# Altium footprint library Connect.PcbLib: 272 footprints (part 16 of 17)
Each footprint in its own frame and in the unit in brackets; x right, y up, seen from the top. Pads: shape width x height; smd on the part's side, far side on the other; paste and mask are expansions set on the pad; w line width, h text height; cw(c..) or ccw(c..) is an arc to the next point about the centre after c.
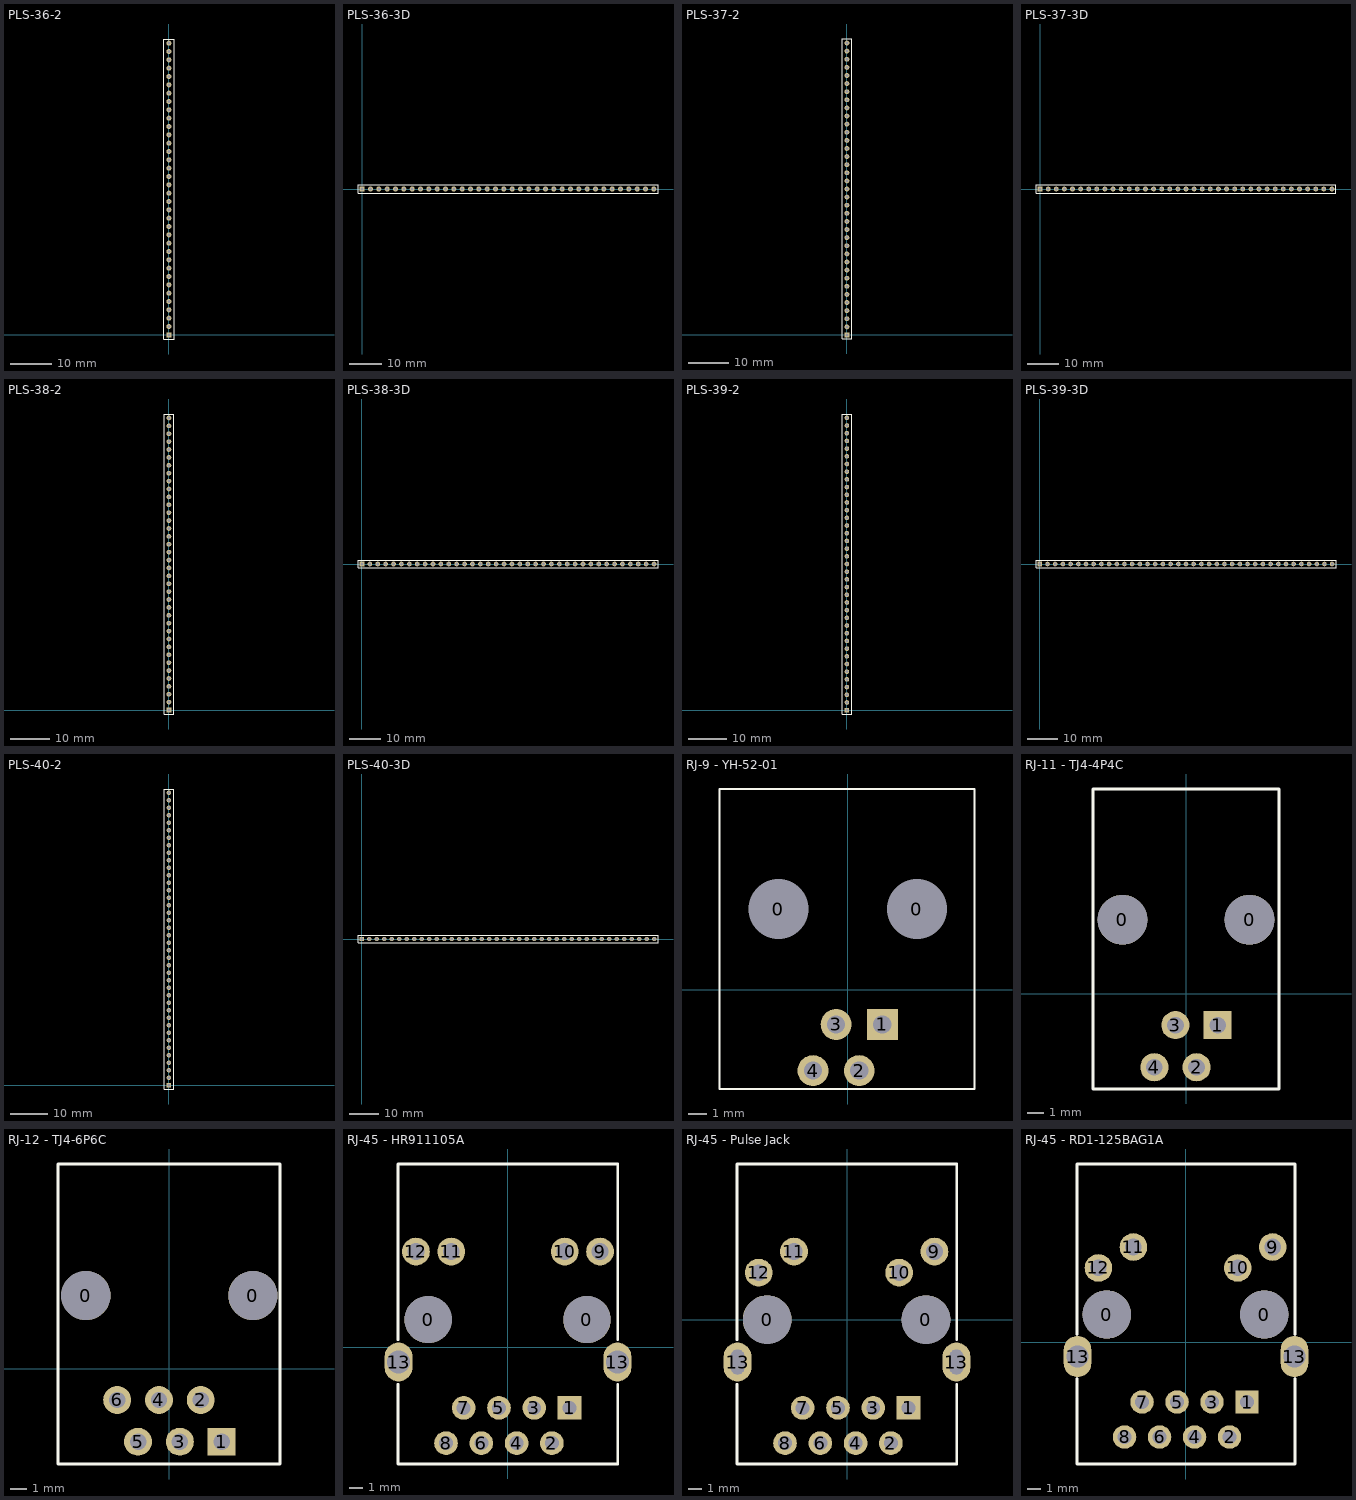
[diagram p15: the footprints below, top view; thin cyan lines are the x and y axes]

## PLS-36-2 [mm] "Connector; Header; 1x36 Position"
height 6
pads (36):
  rect 1.2x1.2 hole 0.75: 1(0,0)
  round 1.2 hole 0.75: 2(0,2) 3(0,4) 4(0,6) 5(0,8)
  round 1.2 hole 0.75 unplated: 6(0,10) 7(0,12) 8(0,14) 9(0,16) 10(0,18) 11(0,20) 12(0,22) 13(0,24) 14(0,26) 15(0,28) 16(0,30) 17(0,32) 18(0,34) 19(0,36) 20(0,38) 21(0,40) 22(0,42) 23(0,44) 24(0,46) 25(0,48) 26(0,50) 27(0,52) 28(0,54) 29(0,56) 30(0,58) 31(0,60) 32(0,62) 33(0,64) 34(0,66) 35(0,68) 36(0,70)
Top Overlay:
  lines w0.2: -1.2,-1 1.25,-1 1.25,71 -1.2,71 -1.2,-1
3D body "pls-2mm.stp": height 5.5, standoff -2.5, extent -1.2,7 1.2,9
3D body "pls-2mm.stp": height 5.5, standoff -2.5, extent -1.2,5 1.2,7
3D body "pls-2mm.stp": height 5.5, standoff -2.5, extent -1.2,3 1.2,5
3D body "pls-2mm.stp": height 5.5, standoff -2.5, extent -1.2,1 1.2,3
3D body "pls-2mm.stp": height 5.5, standoff -2.5, extent -1.2,-1 1.2,1
3D body "pls-2mm.stp": height 5.5, standoff -2.5, extent -1.2,9 1.2,11
3D body "pls-2mm.stp": height 5.5, standoff -2.5, extent -1.2,11 1.2,13
3D body "pls-2mm.stp": height 5.5, standoff -2.5, extent -1.2,13 1.2,15
3D body "pls-2mm.stp": height 5.5, standoff -2.5, extent -1.2,15 1.2,17
3D body "pls-2mm.stp": height 5.5, standoff -2.5, extent -1.2,17 1.2,19
3D body "pls-2mm.stp": height 5.5, standoff -2.5, extent -1.2,19 1.2,21
3D body "pls-2mm.stp": height 5.5, standoff -2.5, extent -1.2,21 1.2,23
3D body "pls-2mm.stp": height 5.5, standoff -2.5, extent -1.2,23 1.2,25
3D body "pls-2mm.stp": height 5.5, standoff -2.5, extent -1.2,25 1.2,27
3D body "pls-2mm.stp": height 5.5, standoff -2.5, extent -1.2,27 1.2,29
3D body "pls-2mm.stp": height 5.5, standoff -2.5, extent -1.2,29 1.2,31
3D body "pls-2mm.stp": height 5.5, standoff -2.5, extent -1.2,31 1.2,33
3D body "pls-2mm.stp": height 5.5, standoff -2.5, extent -1.2,33 1.2,35
3D body "pls-2mm.stp": height 5.5, standoff -2.5, extent -1.2,35 1.2,37
3D body "pls-2mm.stp": height 5.5, standoff -2.5, extent -1.2,37 1.2,39
3D body "pls-2mm.stp": height 5.5, standoff -2.5, extent -1.2,39 1.2,41
3D body "pls-2mm.stp": height 5.5, standoff -2.5, extent -1.2,41 1.2,43
3D body "pls-2mm.stp": height 5.5, standoff -2.5, extent -1.2,43 1.2,45
3D body "pls-2mm.stp": height 5.5, standoff -2.5, extent -1.2,45 1.2,47
3D body "pls-2mm.stp": height 5.5, standoff -2.5, extent -1.2,47 1.2,49
3D body "pls-2mm.stp": height 5.5, standoff -2.5, extent -1.2,49 1.2,51
3D body "pls-2mm.stp": height 5.5, standoff -2.5, extent -1.2,51 1.2,53
3D body "pls-2mm.stp": height 5.5, standoff -2.5, extent -1.2,53 1.2,55
3D body "pls-2mm.stp": height 5.5, standoff -2.5, extent -1.2,55 1.2,57
3D body "pls-2mm.stp": height 5.5, standoff -2.5, extent -1.2,57 1.2,59
3D body "pls-2mm.stp": height 5.5, standoff -2.5, extent -1.2,59 1.2,61
3D body "pls-2mm.stp": height 5.5, standoff -2.5, extent -1.2,61 1.2,63
3D body "pls-2mm.stp": height 5.5, standoff -2.5, extent -1.2,63 1.2,65
3D body "pls-2mm.stp": height 5.5, standoff -2.5, extent -1.2,65 1.2,67
3D body "pls-2mm.stp": height 5.5, standoff -2.5, extent -1.2,67 1.2,69
3D body "pls-2mm.stp": height 5.5, standoff -2.5, extent -1.2,69 1.2,71

## PLS-36-3D [mm] "Connector; Header; 36 Position"
height 7.5
pads (36):
  rect 1.5x1.5 hole 0.9: 1(0,0)
  round 1.5 hole 0.9: 2(2.54,0) 3(5.08,0) 4(7.62,0) 5(10.16,0) 6(12.7,0) 7(15.24,0) 8(17.78,0) 9(20.32,0) 10(22.86,0) 11(25.4,0) 12(27.94,0) 13(30.48,0) 14(33.02,0) 15(35.56,0) 16(38.1,0) 17(40.64,0) 18(43.18,0) 19(45.72,0) 20(48.26,0) 21(50.8,0) 22(53.34,0) 23(55.88,0) 24(58.42,0) 25(60.96,0) 26(63.5,0) 27(66.04,0) 28(68.58,0) 29(71.12,0) 30(73.66,0) 31(76.2,0) 32(78.74,0) 33(81.28,0) 34(83.82,0) 35(86.36,0) 36(88.9,0)
Top Overlay:
  lines w0.2: -1.27,-1.27 90.17,-1.27 90.17,1.27 -1.27,1.27 -1.27,-1.27
3D body "PLS-1.step": height 8.44, standoff -3, extent 87.63,-1.27 90.17,1.27
3D body "PLS-1.step": height 8.44, standoff -3, extent -1.27,-1.27 1.27,1.27
3D body "PLS-1.step": height 8.44, standoff -3, extent 1.27,-1.27 3.81,1.27
3D body "PLS-1.step": height 8.44, standoff -3, extent 3.81,-1.27 6.35,1.27
3D body "PLS-1.step": height 8.44, standoff -3, extent 6.35,-1.27 8.89,1.27
3D body "PLS-1.step": height 8.44, standoff -3, extent 8.89,-1.27 11.43,1.27
3D body "PLS-1.step": height 8.44, standoff -3, extent 11.43,-1.27 13.97,1.27
3D body "PLS-1.step": height 8.44, standoff -3, extent 13.97,-1.27 16.51,1.27
3D body "PLS-1.step": height 8.44, standoff -3, extent 16.51,-1.27 19.05,1.27
3D body "PLS-1.step": height 8.44, standoff -3, extent 19.05,-1.27 21.59,1.27
3D body "PLS-1.step": height 8.44, standoff -3, extent 21.59,-1.27 24.13,1.27
3D body "PLS-1.step": height 8.44, standoff -3, extent 24.13,-1.27 26.67,1.27
3D body "PLS-1.step": height 8.44, standoff -3, extent 26.67,-1.27 29.21,1.27
3D body "PLS-1.step": height 8.44, standoff -3, extent 29.21,-1.27 31.75,1.27
3D body "PLS-1.step": height 8.44, standoff -3, extent 31.75,-1.27 34.29,1.27
3D body "PLS-1.step": height 8.44, standoff -3, extent 34.29,-1.27 36.83,1.27
3D body "PLS-1.step": height 8.44, standoff -3, extent 36.83,-1.27 39.37,1.27
3D body "PLS-1.step": height 8.44, standoff -3, extent 39.37,-1.27 41.91,1.27
3D body "PLS-1.step": height 8.44, standoff -3, extent 41.91,-1.27 44.45,1.27
3D body "PLS-1.step": height 8.44, standoff -3, extent 44.45,-1.27 46.99,1.27
3D body "PLS-1.step": height 8.44, standoff -3, extent 46.99,-1.27 49.53,1.27
3D body "PLS-1.step": height 8.44, standoff -3, extent 49.53,-1.27 52.07,1.27
3D body "PLS-1.step": height 8.44, standoff -3, extent 52.07,-1.27 54.61,1.27
3D body "PLS-1.step": height 8.44, standoff -3, extent 54.61,-1.27 57.15,1.27
3D body "PLS-1.step": height 8.44, standoff -3, extent 57.15,-1.27 59.69,1.27
3D body "PLS-1.step": height 8.44, standoff -3, extent 59.69,-1.27 62.23,1.27
3D body "PLS-1.step": height 8.44, standoff -3, extent 62.23,-1.27 64.77,1.27
3D body "PLS-1.step": height 8.44, standoff -3, extent 64.77,-1.27 67.31,1.27
3D body "PLS-1.step": height 8.44, standoff -3, extent 67.31,-1.27 69.85,1.27
3D body "PLS-1.step": height 8.44, standoff -3, extent 69.85,-1.27 72.39,1.27
3D body "PLS-1.step": height 8.44, standoff -3, extent 72.39,-1.27 74.93,1.27
3D body "PLS-1.step": height 8.44, standoff -3, extent 74.93,-1.27 77.47,1.27
3D body "PLS-1.step": height 8.44, standoff -3, extent 77.47,-1.27 80.01,1.27
3D body "PLS-1.step": height 8.44, standoff -3, extent 80.01,-1.27 82.55,1.27
3D body "PLS-1.step": height 8.44, standoff -3, extent 82.55,-1.27 85.09,1.27
3D body "PLS-1.step": height 8.44, standoff -3, extent 85.09,-1.27 87.63,1.27

## PLS-37-2 [mm] "Connector; Header; 1x37 Position"
height 6
pads (37):
  rect 1.2x1.2 hole 0.75: 1(0,0)
  round 1.2 hole 0.75: 2(0,2) 3(0,4) 4(0,6) 5(0,8)
  round 1.2 hole 0.75 unplated: 6(0,10) 7(0,12) 8(0,14) 9(0,16) 10(0,18) 11(0,20) 12(0,22) 13(0,24) 14(0,26) 15(0,28) 16(0,30) 17(0,32) 18(0,34) 19(0,36) 20(0,38) 21(0,40) 22(0,42) 23(0,44) 24(0,46) 25(0,48) 26(0,50) 27(0,52) 28(0,54) 29(0,56) 30(0,58) 31(0,60) 32(0,62) 33(0,64) 34(0,66) 35(0,68) 36(0,70) 37(0,72)
Top Overlay:
  lines w0.2: -1.2,-1 1.25,-1 1.25,73 -1.2,73 -1.2,-1
3D body "pls-2mm.stp": height 5.5, standoff -2.5, extent -1.2,7 1.2,9
3D body "pls-2mm.stp": height 5.5, standoff -2.5, extent -1.2,5 1.2,7
3D body "pls-2mm.stp": height 5.5, standoff -2.5, extent -1.2,3 1.2,5
3D body "pls-2mm.stp": height 5.5, standoff -2.5, extent -1.2,1 1.2,3
3D body "pls-2mm.stp": height 5.5, standoff -2.5, extent -1.2,-1 1.2,1
3D body "pls-2mm.stp": height 5.5, standoff -2.5, extent -1.2,9 1.2,11
3D body "pls-2mm.stp": height 5.5, standoff -2.5, extent -1.2,11 1.2,13
3D body "pls-2mm.stp": height 5.5, standoff -2.5, extent -1.2,13 1.2,15
3D body "pls-2mm.stp": height 5.5, standoff -2.5, extent -1.2,15 1.2,17
3D body "pls-2mm.stp": height 5.5, standoff -2.5, extent -1.2,17 1.2,19
3D body "pls-2mm.stp": height 5.5, standoff -2.5, extent -1.2,19 1.2,21
3D body "pls-2mm.stp": height 5.5, standoff -2.5, extent -1.2,21 1.2,23
3D body "pls-2mm.stp": height 5.5, standoff -2.5, extent -1.2,23 1.2,25
3D body "pls-2mm.stp": height 5.5, standoff -2.5, extent -1.2,25 1.2,27
3D body "pls-2mm.stp": height 5.5, standoff -2.5, extent -1.2,27 1.2,29
3D body "pls-2mm.stp": height 5.5, standoff -2.5, extent -1.2,29 1.2,31
3D body "pls-2mm.stp": height 5.5, standoff -2.5, extent -1.2,31 1.2,33
3D body "pls-2mm.stp": height 5.5, standoff -2.5, extent -1.2,33 1.2,35
3D body "pls-2mm.stp": height 5.5, standoff -2.5, extent -1.2,35 1.2,37
3D body "pls-2mm.stp": height 5.5, standoff -2.5, extent -1.2,37 1.2,39
3D body "pls-2mm.stp": height 5.5, standoff -2.5, extent -1.2,39 1.2,41
3D body "pls-2mm.stp": height 5.5, standoff -2.5, extent -1.2,41 1.2,43
3D body "pls-2mm.stp": height 5.5, standoff -2.5, extent -1.2,43 1.2,45
3D body "pls-2mm.stp": height 5.5, standoff -2.5, extent -1.2,45 1.2,47
3D body "pls-2mm.stp": height 5.5, standoff -2.5, extent -1.2,47 1.2,49
3D body "pls-2mm.stp": height 5.5, standoff -2.5, extent -1.2,49 1.2,51
3D body "pls-2mm.stp": height 5.5, standoff -2.5, extent -1.2,51 1.2,53
3D body "pls-2mm.stp": height 5.5, standoff -2.5, extent -1.2,53 1.2,55
3D body "pls-2mm.stp": height 5.5, standoff -2.5, extent -1.2,55 1.2,57
3D body "pls-2mm.stp": height 5.5, standoff -2.5, extent -1.2,57 1.2,59
3D body "pls-2mm.stp": height 5.5, standoff -2.5, extent -1.2,59 1.2,61
3D body "pls-2mm.stp": height 5.5, standoff -2.5, extent -1.2,61 1.2,63
3D body "pls-2mm.stp": height 5.5, standoff -2.5, extent -1.2,63 1.2,65
3D body "pls-2mm.stp": height 5.5, standoff -2.5, extent -1.2,65 1.2,67
3D body "pls-2mm.stp": height 5.5, standoff -2.5, extent -1.2,67 1.2,69
3D body "pls-2mm.stp": height 5.5, standoff -2.5, extent -1.2,69 1.2,71
3D body "pls-2mm.stp": height 5.5, standoff -2.5, extent -1.2,71 1.2,73

## PLS-37-3D [mm] "Connector; Header; 37 Position"
height 7.5
pads (37):
  rect 1.5x1.5 hole 0.9: 1(0,0)
  round 1.5 hole 0.9: 2(2.54,0) 3(5.08,0) 4(7.62,0) 5(10.16,0) 6(12.7,0) 7(15.24,0) 8(17.78,0) 9(20.32,0) 10(22.86,0) 11(25.4,0) 12(27.94,0) 13(30.48,0) 14(33.02,0) 15(35.56,0) 16(38.1,0) 17(40.64,0) 18(43.18,0) 19(45.72,0) 20(48.26,0) 21(50.8,0) 22(53.34,0) 23(55.88,0) 24(58.42,0) 25(60.96,0) 26(63.5,0) 27(66.04,0) 28(68.58,0) 29(71.12,0) 30(73.66,0) 31(76.2,0) 32(78.74,0) 33(81.28,0) 34(83.82,0) 35(86.36,0) 36(88.9,0) 37(91.44,0)
Top Overlay:
  lines w0.2: -1.27,-1.27 -1.27,1.27 92.71,1.27 92.71,-1.27 -1.27,-1.27
3D body "PLS-1.step": height 8.44, standoff -3, extent -1.27,-1.27 1.27,1.27
3D body "PLS-1.step": height 8.44, standoff -3, extent 1.27,-1.27 3.81,1.27
3D body "PLS-1.step": height 8.44, standoff -3, extent 3.81,-1.27 6.35,1.27
3D body "PLS-1.step": height 8.44, standoff -3, extent 6.35,-1.27 8.89,1.27
3D body "PLS-1.step": height 8.44, standoff -3, extent 8.89,-1.27 11.43,1.27
3D body "PLS-1.step": height 8.44, standoff -3, extent 11.43,-1.27 13.97,1.27
3D body "PLS-1.step": height 8.44, standoff -3, extent 13.97,-1.27 16.51,1.27
3D body "PLS-1.step": height 8.44, standoff -3, extent 16.51,-1.27 19.05,1.27
3D body "PLS-1.step": height 8.44, standoff -3, extent 19.05,-1.27 21.59,1.27
3D body "PLS-1.step": height 8.44, standoff -3, extent 21.59,-1.27 24.13,1.27
3D body "PLS-1.step": height 8.44, standoff -3, extent 24.13,-1.27 26.67,1.27
3D body "PLS-1.step": height 8.44, standoff -3, extent 26.67,-1.27 29.21,1.27
3D body "PLS-1.step": height 8.44, standoff -3, extent 29.21,-1.27 31.75,1.27
3D body "PLS-1.step": height 8.44, standoff -3, extent 31.75,-1.27 34.29,1.27
3D body "PLS-1.step": height 8.44, standoff -3, extent 34.29,-1.27 36.83,1.27
3D body "PLS-1.step": height 8.44, standoff -3, extent 36.83,-1.27 39.37,1.27
3D body "PLS-1.step": height 8.44, standoff -3, extent 39.37,-1.27 41.91,1.27
3D body "PLS-1.step": height 8.44, standoff -3, extent 41.91,-1.27 44.45,1.27
3D body "PLS-1.step": height 8.44, standoff -3, extent 44.45,-1.27 46.99,1.27
3D body "PLS-1.step": height 8.44, standoff -3, extent 46.99,-1.27 49.53,1.27
3D body "PLS-1.step": height 8.44, standoff -3, extent 49.53,-1.27 52.07,1.27
3D body "PLS-1.step": height 8.44, standoff -3, extent 52.07,-1.27 54.61,1.27
3D body "PLS-1.step": height 8.44, standoff -3, extent 54.61,-1.27 57.15,1.27
3D body "PLS-1.step": height 8.44, standoff -3, extent 57.15,-1.27 59.69,1.27
3D body "PLS-1.step": height 8.44, standoff -3, extent 59.69,-1.27 62.23,1.27
3D body "PLS-1.step": height 8.44, standoff -3, extent 62.23,-1.27 64.77,1.27
3D body "PLS-1.step": height 8.44, standoff -3, extent 64.77,-1.27 67.31,1.27
3D body "PLS-1.step": height 8.44, standoff -3, extent 67.31,-1.27 69.85,1.27
3D body "PLS-1.step": height 8.44, standoff -3, extent 69.85,-1.27 72.39,1.27
3D body "PLS-1.step": height 8.44, standoff -3, extent 72.39,-1.27 74.93,1.27
3D body "PLS-1.step": height 8.44, standoff -3, extent 74.93,-1.27 77.47,1.27
3D body "PLS-1.step": height 8.44, standoff -3, extent 77.47,-1.27 80.01,1.27
3D body "PLS-1.step": height 8.44, standoff -3, extent 80.01,-1.27 82.55,1.27
3D body "PLS-1.step": height 8.44, standoff -3, extent 82.55,-1.27 85.09,1.27
3D body "PLS-1.step": height 8.44, standoff -3, extent 85.09,-1.27 87.63,1.27
3D body "PLS-1.step": height 8.44, standoff -3, extent 87.63,-1.27 90.17,1.27
3D body "PLS-1.step": height 8.44, standoff -3, extent 90.17,-1.27 92.71,1.27

## PLS-38-2 [mm] "Connector; Header; 1x38 Position"
height 6
pads (38):
  rect 1.2x1.2 hole 0.75: 1(0,0)
  round 1.2 hole 0.75: 2(0,2) 3(0,4) 4(0,6) 5(0,8)
  round 1.2 hole 0.75 unplated: 6(0,10) 7(0,12) 8(0,14) 9(0,16) 10(0,18) 11(0,20) 12(0,22) 13(0,24) 14(0,26) 15(0,28) 16(0,30) 17(0,32) 18(0,34) 19(0,36) 20(0,38) 21(0,40) 22(0,42) 23(0,44) 24(0,46) 25(0,48) 26(0,50) 27(0,52) 28(0,54) 29(0,56) 30(0,58) 31(0,60) 32(0,62) 33(0,64) 34(0,66) 35(0,68) 36(0,70) 37(0,72) 38(0,74)
Top Overlay:
  lines w0.2: -1.2,-1 -1.2,75 1.25,75 1.25,-1 -1.2,-1
3D body "pls-2mm.stp": height 5.5, standoff -2.5, extent -1.2,73 1.2,75
3D body "pls-2mm.stp": height 5.5, standoff -2.5, extent -1.2,71 1.2,73
3D body "pls-2mm.stp": height 5.5, standoff -2.5, extent -1.2,69 1.2,71
3D body "pls-2mm.stp": height 5.5, standoff -2.5, extent -1.2,67 1.2,69
3D body "pls-2mm.stp": height 5.5, standoff -2.5, extent -1.2,65 1.2,67
3D body "pls-2mm.stp": height 5.5, standoff -2.5, extent -1.2,63 1.2,65
3D body "pls-2mm.stp": height 5.5, standoff -2.5, extent -1.2,61 1.2,63
3D body "pls-2mm.stp": height 5.5, standoff -2.5, extent -1.2,59 1.2,61
3D body "pls-2mm.stp": height 5.5, standoff -2.5, extent -1.2,57 1.2,59
3D body "pls-2mm.stp": height 5.5, standoff -2.5, extent -1.2,55 1.2,57
3D body "pls-2mm.stp": height 5.5, standoff -2.5, extent -1.2,53 1.2,55
3D body "pls-2mm.stp": height 5.5, standoff -2.5, extent -1.2,51 1.2,53
3D body "pls-2mm.stp": height 5.5, standoff -2.5, extent -1.2,49 1.2,51
3D body "pls-2mm.stp": height 5.5, standoff -2.5, extent -1.2,47 1.2,49
3D body "pls-2mm.stp": height 5.5, standoff -2.5, extent -1.2,45 1.2,47
3D body "pls-2mm.stp": height 5.5, standoff -2.5, extent -1.2,43 1.2,45
3D body "pls-2mm.stp": height 5.5, standoff -2.5, extent -1.2,41 1.2,43
3D body "pls-2mm.stp": height 5.5, standoff -2.5, extent -1.2,39 1.2,41
3D body "pls-2mm.stp": height 5.5, standoff -2.5, extent -1.2,37 1.2,39
3D body "pls-2mm.stp": height 5.5, standoff -2.5, extent -1.2,35 1.2,37
3D body "pls-2mm.stp": height 5.5, standoff -2.5, extent -1.2,33 1.2,35
3D body "pls-2mm.stp": height 5.5, standoff -2.5, extent -1.2,31 1.2,33
3D body "pls-2mm.stp": height 5.5, standoff -2.5, extent -1.2,29 1.2,31
3D body "pls-2mm.stp": height 5.5, standoff -2.5, extent -1.2,27 1.2,29
3D body "pls-2mm.stp": height 5.5, standoff -2.5, extent -1.2,25 1.2,27
3D body "pls-2mm.stp": height 5.5, standoff -2.5, extent -1.2,23 1.2,25
3D body "pls-2mm.stp": height 5.5, standoff -2.5, extent -1.2,21 1.2,23
3D body "pls-2mm.stp": height 5.5, standoff -2.5, extent -1.2,19 1.2,21
3D body "pls-2mm.stp": height 5.5, standoff -2.5, extent -1.2,17 1.2,19
3D body "pls-2mm.stp": height 5.5, standoff -2.5, extent -1.2,15 1.2,17
3D body "pls-2mm.stp": height 5.5, standoff -2.5, extent -1.2,13 1.2,15
3D body "pls-2mm.stp": height 5.5, standoff -2.5, extent -1.2,11 1.2,13
3D body "pls-2mm.stp": height 5.5, standoff -2.5, extent -1.2,9 1.2,11
3D body "pls-2mm.stp": height 5.5, standoff -2.5, extent -1.2,-1 1.2,1
3D body "pls-2mm.stp": height 5.5, standoff -2.5, extent -1.2,1 1.2,3
3D body "pls-2mm.stp": height 5.5, standoff -2.5, extent -1.2,3 1.2,5
3D body "pls-2mm.stp": height 5.5, standoff -2.5, extent -1.2,5 1.2,7
3D body "pls-2mm.stp": height 5.5, standoff -2.5, extent -1.2,7 1.2,9

## PLS-38-3D [mm] "Connector; Header; 38 Position"
height 7.5
pads (38):
  rect 1.5x1.5 hole 0.9: 1(0,0)
  round 1.5 hole 0.9: 2(2.54,0) 3(5.08,0) 4(7.62,0) 5(10.16,0) 6(12.7,0) 7(15.24,0) 8(17.78,0) 9(20.32,0) 10(22.86,0) 11(25.4,0) 12(27.94,0) 13(30.48,0) 14(33.02,0) 15(35.56,0) 16(38.1,0) 17(40.64,0) 18(43.18,0) 19(45.72,0) 20(48.26,0) 21(50.8,0) 22(53.34,0) 23(55.88,0) 24(58.42,0) 25(60.96,0) 26(63.5,0) 27(66.04,0) 28(68.58,0) 29(71.12,0) 30(73.66,0) 31(76.2,0) 32(78.74,0) 33(81.28,0) 34(83.82,0) 35(86.36,0) 36(88.9,0) 37(91.44,0) 38(93.98,0)
Top Overlay:
  lines w0.2: -1.27,-1.27 95.25,-1.27 95.25,1.27 -1.27,1.27 -1.27,-1.27
3D body "PLS-1.step": height 8.44, standoff -3, extent 85.09,-1.27 87.63,1.27
3D body "PLS-1.step": height 8.44, standoff -3, extent 82.55,-1.27 85.09,1.27
3D body "PLS-1.step": height 8.44, standoff -3, extent 80.01,-1.27 82.55,1.27
3D body "PLS-1.step": height 8.44, standoff -3, extent 77.47,-1.27 80.01,1.27
3D body "PLS-1.step": height 8.44, standoff -3, extent 74.93,-1.27 77.47,1.27
3D body "PLS-1.step": height 8.44, standoff -3, extent 72.39,-1.27 74.93,1.27
3D body "PLS-1.step": height 8.44, standoff -3, extent 69.85,-1.27 72.39,1.27
3D body "PLS-1.step": height 8.44, standoff -3, extent 67.31,-1.27 69.85,1.27
3D body "PLS-1.step": height 8.44, standoff -3, extent 64.77,-1.27 67.31,1.27
3D body "PLS-1.step": height 8.44, standoff -3, extent 62.23,-1.27 64.77,1.27
3D body "PLS-1.step": height 8.44, standoff -3, extent 59.69,-1.27 62.23,1.27
3D body "PLS-1.step": height 8.44, standoff -3, extent 57.15,-1.27 59.69,1.27
3D body "PLS-1.step": height 8.44, standoff -3, extent 54.61,-1.27 57.15,1.27
3D body "PLS-1.step": height 8.44, standoff -3, extent 52.07,-1.27 54.61,1.27
3D body "PLS-1.step": height 8.44, standoff -3, extent 49.53,-1.27 52.07,1.27
3D body "PLS-1.step": height 8.44, standoff -3, extent 46.99,-1.27 49.53,1.27
3D body "PLS-1.step": height 8.44, standoff -3, extent 44.45,-1.27 46.99,1.27
3D body "PLS-1.step": height 8.44, standoff -3, extent 41.91,-1.27 44.45,1.27
3D body "PLS-1.step": height 8.44, standoff -3, extent 39.37,-1.27 41.91,1.27
3D body "PLS-1.step": height 8.44, standoff -3, extent 36.83,-1.27 39.37,1.27
3D body "PLS-1.step": height 8.44, standoff -3, extent 34.29,-1.27 36.83,1.27
3D body "PLS-1.step": height 8.44, standoff -3, extent 31.75,-1.27 34.29,1.27
3D body "PLS-1.step": height 8.44, standoff -3, extent 29.21,-1.27 31.75,1.27
3D body "PLS-1.step": height 8.44, standoff -3, extent 26.67,-1.27 29.21,1.27
3D body "PLS-1.step": height 8.44, standoff -3, extent 24.13,-1.27 26.67,1.27
3D body "PLS-1.step": height 8.44, standoff -3, extent 21.59,-1.27 24.13,1.27
3D body "PLS-1.step": height 8.44, standoff -3, extent 19.05,-1.27 21.59,1.27
3D body "PLS-1.step": height 8.44, standoff -3, extent 16.51,-1.27 19.05,1.27
3D body "PLS-1.step": height 8.44, standoff -3, extent 13.97,-1.27 16.51,1.27
3D body "PLS-1.step": height 8.44, standoff -3, extent 11.43,-1.27 13.97,1.27
3D body "PLS-1.step": height 8.44, standoff -3, extent 8.89,-1.27 11.43,1.27
3D body "PLS-1.step": height 8.44, standoff -3, extent 6.35,-1.27 8.89,1.27
3D body "PLS-1.step": height 8.44, standoff -3, extent 3.81,-1.27 6.35,1.27
3D body "PLS-1.step": height 8.44, standoff -3, extent 1.27,-1.27 3.81,1.27
3D body "PLS-1.step": height 8.44, standoff -3, extent -1.27,-1.27 1.27,1.27
3D body "PLS-1.step": height 8.44, standoff -3, extent 87.63,-1.27 90.17,1.27
3D body "PLS-1.step": height 8.44, standoff -3, extent 90.17,-1.27 92.71,1.27
3D body "PLS-1.step": height 8.44, standoff -3, extent 92.71,-1.27 95.25,1.27

## PLS-39-2 [mm] "Connector; Header; 1x39 Position"
height 6
pads (39):
  rect 1.2x1.2 hole 0.75: 1(0,0)
  round 1.2 hole 0.75: 2(0,2) 3(0,4) 4(0,6) 5(0,8)
  round 1.2 hole 0.75 unplated: 6(0,10) 7(0,12) 8(0,14) 9(0,16) 10(0,18) 11(0,20) 12(0,22) 13(0,24) 14(0,26) 15(0,28) 16(0,30) 17(0,32) 18(0,34) 19(0,36) 20(0,38) 21(0,40) 22(0,42) 23(0,44) 24(0,46) 25(0,48) 26(0,50) 27(0,52) 28(0,54) 29(0,56) 30(0,58) 31(0,60) 32(0,62) 33(0,64) 34(0,66) 35(0,68) 36(0,70) 37(0,72) 38(0,74) 39(0,76)
Top Overlay:
  lines w0.2: -1.2,-1 -1.2,77 1.25,77 1.25,-1 -1.2,-1
3D body "pls-2mm.stp": height 5.5, standoff -2.5, extent -1.2,75 1.2,77
3D body "pls-2mm.stp": height 5.5, standoff -2.5, extent -1.2,73 1.2,75
3D body "pls-2mm.stp": height 5.5, standoff -2.5, extent -1.2,71 1.2,73
3D body "pls-2mm.stp": height 5.5, standoff -2.5, extent -1.2,69 1.2,71
3D body "pls-2mm.stp": height 5.5, standoff -2.5, extent -1.2,67 1.2,69
3D body "pls-2mm.stp": height 5.5, standoff -2.5, extent -1.2,65 1.2,67
3D body "pls-2mm.stp": height 5.5, standoff -2.5, extent -1.2,63 1.2,65
3D body "pls-2mm.stp": height 5.5, standoff -2.5, extent -1.2,61 1.2,63
3D body "pls-2mm.stp": height 5.5, standoff -2.5, extent -1.2,59 1.2,61
3D body "pls-2mm.stp": height 5.5, standoff -2.5, extent -1.2,57 1.2,59
3D body "pls-2mm.stp": height 5.5, standoff -2.5, extent -1.2,55 1.2,57
3D body "pls-2mm.stp": height 5.5, standoff -2.5, extent -1.2,53 1.2,55
3D body "pls-2mm.stp": height 5.5, standoff -2.5, extent -1.2,51 1.2,53
3D body "pls-2mm.stp": height 5.5, standoff -2.5, extent -1.2,49 1.2,51
3D body "pls-2mm.stp": height 5.5, standoff -2.5, extent -1.2,47 1.2,49
3D body "pls-2mm.stp": height 5.5, standoff -2.5, extent -1.2,45 1.2,47
3D body "pls-2mm.stp": height 5.5, standoff -2.5, extent -1.2,43 1.2,45
3D body "pls-2mm.stp": height 5.5, standoff -2.5, extent -1.2,41 1.2,43
3D body "pls-2mm.stp": height 5.5, standoff -2.5, extent -1.2,39 1.2,41
3D body "pls-2mm.stp": height 5.5, standoff -2.5, extent -1.2,37 1.2,39
3D body "pls-2mm.stp": height 5.5, standoff -2.5, extent -1.2,35 1.2,37
3D body "pls-2mm.stp": height 5.5, standoff -2.5, extent -1.2,33 1.2,35
3D body "pls-2mm.stp": height 5.5, standoff -2.5, extent -1.2,31 1.2,33
3D body "pls-2mm.stp": height 5.5, standoff -2.5, extent -1.2,29 1.2,31
3D body "pls-2mm.stp": height 5.5, standoff -2.5, extent -1.2,27 1.2,29
3D body "pls-2mm.stp": height 5.5, standoff -2.5, extent -1.2,25 1.2,27
3D body "pls-2mm.stp": height 5.5, standoff -2.5, extent -1.2,23 1.2,25
3D body "pls-2mm.stp": height 5.5, standoff -2.5, extent -1.2,21 1.2,23
3D body "pls-2mm.stp": height 5.5, standoff -2.5, extent -1.2,19 1.2,21
3D body "pls-2mm.stp": height 5.5, standoff -2.5, extent -1.2,17 1.2,19
3D body "pls-2mm.stp": height 5.5, standoff -2.5, extent -1.2,15 1.2,17
3D body "pls-2mm.stp": height 5.5, standoff -2.5, extent -1.2,13 1.2,15
3D body "pls-2mm.stp": height 5.5, standoff -2.5, extent -1.2,11 1.2,13
3D body "pls-2mm.stp": height 5.5, standoff -2.5, extent -1.2,9 1.2,11
3D body "pls-2mm.stp": height 5.5, standoff -2.5, extent -1.2,-1 1.2,1
3D body "pls-2mm.stp": height 5.5, standoff -2.5, extent -1.2,1 1.2,3
3D body "pls-2mm.stp": height 5.5, standoff -2.5, extent -1.2,3 1.2,5
3D body "pls-2mm.stp": height 5.5, standoff -2.5, extent -1.2,5 1.2,7
3D body "pls-2mm.stp": height 5.5, standoff -2.5, extent -1.2,7 1.2,9

## PLS-39-3D [mm] "Connector; Header; 39 Position"
height 7.5
pads (39):
  rect 1.5x1.5 hole 0.9: 1(0,0)
  round 1.5 hole 0.9: 2(2.54,0) 3(5.08,0) 4(7.62,0) 5(10.16,0) 6(12.7,0) 7(15.24,0) 8(17.78,0) 9(20.32,0) 10(22.86,0) 11(25.4,0) 12(27.94,0) 13(30.48,0) 14(33.02,0) 15(35.56,0) 16(38.1,0) 17(40.64,0) 18(43.18,0) 19(45.72,0) 20(48.26,0) 21(50.8,0) 22(53.34,0) 23(55.88,0) 24(58.42,0) 25(60.96,0) 26(63.5,0) 27(66.04,0) 28(68.58,0) 29(71.12,0) 30(73.66,0) 31(76.2,0) 32(78.74,0) 33(81.28,0) 34(83.82,0) 35(86.36,0) 36(88.9,0) 37(91.44,0) 38(93.98,0) 39(96.52,0)
Top Overlay:
  lines w0.2: -1.27,-1.27 97.79,-1.27 97.79,1.27 -1.27,1.27 -1.27,-1.27
3D body "PLS-1.step": height 8.44, standoff -3, extent 85.09,-1.27 87.63,1.27
3D body "PLS-1.step": height 8.44, standoff -3, extent 82.55,-1.27 85.09,1.27
3D body "PLS-1.step": height 8.44, standoff -3, extent 80.01,-1.27 82.55,1.27
3D body "PLS-1.step": height 8.44, standoff -3, extent 77.47,-1.27 80.01,1.27
3D body "PLS-1.step": height 8.44, standoff -3, extent 74.93,-1.27 77.47,1.27
3D body "PLS-1.step": height 8.44, standoff -3, extent 72.39,-1.27 74.93,1.27
3D body "PLS-1.step": height 8.44, standoff -3, extent 69.85,-1.27 72.39,1.27
3D body "PLS-1.step": height 8.44, standoff -3, extent 67.31,-1.27 69.85,1.27
3D body "PLS-1.step": height 8.44, standoff -3, extent 64.77,-1.27 67.31,1.27
3D body "PLS-1.step": height 8.44, standoff -3, extent 62.23,-1.27 64.77,1.27
3D body "PLS-1.step": height 8.44, standoff -3, extent 59.69,-1.27 62.23,1.27
3D body "PLS-1.step": height 8.44, standoff -3, extent 57.15,-1.27 59.69,1.27
3D body "PLS-1.step": height 8.44, standoff -3, extent 54.61,-1.27 57.15,1.27
3D body "PLS-1.step": height 8.44, standoff -3, extent 52.07,-1.27 54.61,1.27
3D body "PLS-1.step": height 8.44, standoff -3, extent 49.53,-1.27 52.07,1.27
3D body "PLS-1.step": height 8.44, standoff -3, extent 46.99,-1.27 49.53,1.27
3D body "PLS-1.step": height 8.44, standoff -3, extent 44.45,-1.27 46.99,1.27
3D body "PLS-1.step": height 8.44, standoff -3, extent 41.91,-1.27 44.45,1.27
3D body "PLS-1.step": height 8.44, standoff -3, extent 39.37,-1.27 41.91,1.27
3D body "PLS-1.step": height 8.44, standoff -3, extent 36.83,-1.27 39.37,1.27
3D body "PLS-1.step": height 8.44, standoff -3, extent 34.29,-1.27 36.83,1.27
3D body "PLS-1.step": height 8.44, standoff -3, extent 31.75,-1.27 34.29,1.27
3D body "PLS-1.step": height 8.44, standoff -3, extent 29.21,-1.27 31.75,1.27
3D body "PLS-1.step": height 8.44, standoff -3, extent 26.67,-1.27 29.21,1.27
3D body "PLS-1.step": height 8.44, standoff -3, extent 24.13,-1.27 26.67,1.27
3D body "PLS-1.step": height 8.44, standoff -3, extent 21.59,-1.27 24.13,1.27
3D body "PLS-1.step": height 8.44, standoff -3, extent 19.05,-1.27 21.59,1.27
3D body "PLS-1.step": height 8.44, standoff -3, extent 16.51,-1.27 19.05,1.27
3D body "PLS-1.step": height 8.44, standoff -3, extent 13.97,-1.27 16.51,1.27
3D body "PLS-1.step": height 8.44, standoff -3, extent 11.43,-1.27 13.97,1.27
3D body "PLS-1.step": height 8.44, standoff -3, extent 8.89,-1.27 11.43,1.27
3D body "PLS-1.step": height 8.44, standoff -3, extent 6.35,-1.27 8.89,1.27
3D body "PLS-1.step": height 8.44, standoff -3, extent 3.81,-1.27 6.35,1.27
3D body "PLS-1.step": height 8.44, standoff -3, extent 1.27,-1.27 3.81,1.27
3D body "PLS-1.step": height 8.44, standoff -3, extent -1.27,-1.27 1.27,1.27
3D body "PLS-1.step": height 8.44, standoff -3, extent 87.63,-1.27 90.17,1.27
3D body "PLS-1.step": height 8.44, standoff -3, extent 90.17,-1.27 92.71,1.27
3D body "PLS-1.step": height 8.44, standoff -3, extent 92.71,-1.27 95.25,1.27
3D body "PLS-1.step": height 8.44, standoff -3, extent 95.25,-1.27 97.79,1.27

## PLS-40-2 [mm] "Connector; Header; 1x40 Position"
height 6
pads (40):
  rect 1.2x1.2 hole 0.75: 1(0,0)
  round 1.2 hole 0.75: 2(0,2) 3(0,4) 4(0,6) 5(0,8)
  round 1.2 hole 0.75 unplated: 6(0,10) 7(0,12) 8(0,14) 9(0,16) 10(0,18) 11(0,20) 12(0,22) 13(0,24) 14(0,26) 15(0,28) 16(0,30) 17(0,32) 18(0,34) 19(0,36) 20(0,38) 21(0,40) 22(0,42) 23(0,44) 24(0,46) 25(0,48) 26(0,50) 27(0,52) 28(0,54) 29(0,56) 30(0,58) 31(0,60) 32(0,62) 33(0,64) 34(0,66) 35(0,68) 36(0,70) 37(0,72) 38(0,74) 39(0,76) 40(0,78)
Top Overlay:
  lines w0.2: -1.2,-1 -1.2,79 1.25,79 1.25,-1 -1.2,-1
3D body "pls-2mm.stp": height 5.5, standoff -2.5, extent -1.2,77 1.2,79
3D body "pls-2mm.stp": height 5.5, standoff -2.5, extent -1.2,75 1.2,77
3D body "pls-2mm.stp": height 5.5, standoff -2.5, extent -1.2,73 1.2,75
3D body "pls-2mm.stp": height 5.5, standoff -2.5, extent -1.2,71 1.2,73
3D body "pls-2mm.stp": height 5.5, standoff -2.5, extent -1.2,69 1.2,71
3D body "pls-2mm.stp": height 5.5, standoff -2.5, extent -1.2,67 1.2,69
3D body "pls-2mm.stp": height 5.5, standoff -2.5, extent -1.2,65 1.2,67
3D body "pls-2mm.stp": height 5.5, standoff -2.5, extent -1.2,63 1.2,65
3D body "pls-2mm.stp": height 5.5, standoff -2.5, extent -1.2,61 1.2,63
3D body "pls-2mm.stp": height 5.5, standoff -2.5, extent -1.2,59 1.2,61
3D body "pls-2mm.stp": height 5.5, standoff -2.5, extent -1.2,57 1.2,59
3D body "pls-2mm.stp": height 5.5, standoff -2.5, extent -1.2,55 1.2,57
3D body "pls-2mm.stp": height 5.5, standoff -2.5, extent -1.2,53 1.2,55
3D body "pls-2mm.stp": height 5.5, standoff -2.5, extent -1.2,51 1.2,53
3D body "pls-2mm.stp": height 5.5, standoff -2.5, extent -1.2,49 1.2,51
3D body "pls-2mm.stp": height 5.5, standoff -2.5, extent -1.2,47 1.2,49
3D body "pls-2mm.stp": height 5.5, standoff -2.5, extent -1.2,45 1.2,47
3D body "pls-2mm.stp": height 5.5, standoff -2.5, extent -1.2,43 1.2,45
3D body "pls-2mm.stp": height 5.5, standoff -2.5, extent -1.2,41 1.2,43
3D body "pls-2mm.stp": height 5.5, standoff -2.5, extent -1.2,39 1.2,41
3D body "pls-2mm.stp": height 5.5, standoff -2.5, extent -1.2,37 1.2,39
3D body "pls-2mm.stp": height 5.5, standoff -2.5, extent -1.2,35 1.2,37
3D body "pls-2mm.stp": height 5.5, standoff -2.5, extent -1.2,33 1.2,35
3D body "pls-2mm.stp": height 5.5, standoff -2.5, extent -1.2,31 1.2,33
3D body "pls-2mm.stp": height 5.5, standoff -2.5, extent -1.2,29 1.2,31
3D body "pls-2mm.stp": height 5.5, standoff -2.5, extent -1.2,27 1.2,29
3D body "pls-2mm.stp": height 5.5, standoff -2.5, extent -1.2,25 1.2,27
3D body "pls-2mm.stp": height 5.5, standoff -2.5, extent -1.2,23 1.2,25
3D body "pls-2mm.stp": height 5.5, standoff -2.5, extent -1.2,21 1.2,23
3D body "pls-2mm.stp": height 5.5, standoff -2.5, extent -1.2,19 1.2,21
3D body "pls-2mm.stp": height 5.5, standoff -2.5, extent -1.2,17 1.2,19
3D body "pls-2mm.stp": height 5.5, standoff -2.5, extent -1.2,15 1.2,17
3D body "pls-2mm.stp": height 5.5, standoff -2.5, extent -1.2,13 1.2,15
3D body "pls-2mm.stp": height 5.5, standoff -2.5, extent -1.2,11 1.2,13
3D body "pls-2mm.stp": height 5.5, standoff -2.5, extent -1.2,9 1.2,11
3D body "pls-2mm.stp": height 5.5, standoff -2.5, extent -1.2,-1 1.2,1
3D body "pls-2mm.stp": height 5.5, standoff -2.5, extent -1.2,1 1.2,3
3D body "pls-2mm.stp": height 5.5, standoff -2.5, extent -1.2,3 1.2,5
3D body "pls-2mm.stp": height 5.5, standoff -2.5, extent -1.2,5 1.2,7
3D body "pls-2mm.stp": height 5.5, standoff -2.5, extent -1.2,7 1.2,9

## PLS-40-3D [mm] "Connector; Header; 40 Position"
height 7.5
pads (40):
  rect 1.5x1.5 hole 0.9: 1(0,0)
  round 1.5 hole 0.9: 2(2.54,0) 3(5.08,0) 4(7.62,0) 5(10.16,0) 6(12.7,0) 7(15.24,0) 8(17.78,0) 9(20.32,0) 10(22.86,0) 11(25.4,0) 12(27.94,0) 13(30.48,0) 14(33.02,0) 15(35.56,0) 16(38.1,0) 17(40.64,0) 18(43.18,0) 19(45.72,0) 20(48.26,0) 21(50.8,0) 22(53.34,0) 23(55.88,0) 24(58.42,0) 25(60.96,0) 26(63.5,0) 27(66.04,0) 28(68.58,0) 29(71.12,0) 30(73.66,0) 31(76.2,0) 32(78.74,0) 33(81.28,0) 34(83.82,0) 35(86.36,0) 36(88.9,0) 37(91.44,0) 38(93.98,0) 39(96.52,0) 40(99.06,0)
Top Overlay:
  lines w0.2: -1.27,-1.27 -1.27,1.27 100.33,1.27 100.33,-1.27 -1.27,-1.27
3D body "PLS-1.step": height 8.44, standoff -3, extent 97.79,-1.27 100.33,1.27
3D body "PLS-1.step": height 8.44, standoff -3, extent 95.25,-1.27 97.79,1.27
3D body "PLS-1.step": height 8.44, standoff -3, extent 92.71,-1.27 95.25,1.27
3D body "PLS-1.step": height 8.44, standoff -3, extent 90.17,-1.27 92.71,1.27
3D body "PLS-1.step": height 8.44, standoff -3, extent 87.63,-1.27 90.17,1.27
3D body "PLS-1.step": height 8.44, standoff -3, extent 85.09,-1.27 87.63,1.27
3D body "PLS-1.step": height 8.44, standoff -3, extent 82.55,-1.27 85.09,1.27
3D body "PLS-1.step": height 8.44, standoff -3, extent 80.01,-1.27 82.55,1.27
3D body "PLS-1.step": height 8.44, standoff -3, extent 77.47,-1.27 80.01,1.27
3D body "PLS-1.step": height 8.44, standoff -3, extent 74.93,-1.27 77.47,1.27
3D body "PLS-1.step": height 8.44, standoff -3, extent 72.39,-1.27 74.93,1.27
3D body "PLS-1.step": height 8.44, standoff -3, extent 69.85,-1.27 72.39,1.27
3D body "PLS-1.step": height 8.44, standoff -3, extent 67.31,-1.27 69.85,1.27
3D body "PLS-1.step": height 8.44, standoff -3, extent 64.77,-1.27 67.31,1.27
3D body "PLS-1.step": height 8.44, standoff -3, extent 62.23,-1.27 64.77,1.27
3D body "PLS-1.step": height 8.44, standoff -3, extent 59.69,-1.27 62.23,1.27
3D body "PLS-1.step": height 8.44, standoff -3, extent 57.15,-1.27 59.69,1.27
3D body "PLS-1.step": height 8.44, standoff -3, extent 54.61,-1.27 57.15,1.27
3D body "PLS-1.step": height 8.44, standoff -3, extent 52.07,-1.27 54.61,1.27
3D body "PLS-1.step": height 8.44, standoff -3, extent 49.53,-1.27 52.07,1.27
3D body "PLS-1.step": height 8.44, standoff -3, extent 46.99,-1.27 49.53,1.27
3D body "PLS-1.step": height 8.44, standoff -3, extent 44.45,-1.27 46.99,1.27
3D body "PLS-1.step": height 8.44, standoff -3, extent 41.91,-1.27 44.45,1.27
3D body "PLS-1.step": height 8.44, standoff -3, extent 39.37,-1.27 41.91,1.27
3D body "PLS-1.step": height 8.44, standoff -3, extent 36.83,-1.27 39.37,1.27
3D body "PLS-1.step": height 8.44, standoff -3, extent 34.29,-1.27 36.83,1.27
3D body "PLS-1.step": height 8.44, standoff -3, extent 31.75,-1.27 34.29,1.27
3D body "PLS-1.step": height 8.44, standoff -3, extent 29.21,-1.27 31.75,1.27
3D body "PLS-1.step": height 8.44, standoff -3, extent 26.67,-1.27 29.21,1.27
3D body "PLS-1.step": height 8.44, standoff -3, extent 24.13,-1.27 26.67,1.27
3D body "PLS-1.step": height 8.44, standoff -3, extent 21.59,-1.27 24.13,1.27
3D body "PLS-1.step": height 8.44, standoff -3, extent 19.05,-1.27 21.59,1.27
3D body "PLS-1.step": height 8.44, standoff -3, extent 16.51,-1.27 19.05,1.27
3D body "PLS-1.step": height 8.44, standoff -3, extent 13.97,-1.27 16.51,1.27
3D body "PLS-1.step": height 8.44, standoff -3, extent 11.43,-1.27 13.97,1.27
3D body "PLS-1.step": height 8.44, standoff -3, extent 8.89,-1.27 11.43,1.27
3D body "PLS-1.step": height 8.44, standoff -3, extent 6.35,-1.27 8.89,1.27
3D body "PLS-1.step": height 8.44, standoff -3, extent 3.81,-1.27 6.35,1.27
3D body "PLS-1.step": height 8.44, standoff -3, extent 1.27,-1.27 3.81,1.27
3D body "PLS-1.step": height 8.44, standoff -3, extent -1.27,-1.27 1.27,1.27

## RJ-9 - YH-52-01 [mm] "Telephone connector"
height 16.38
pads (6):
  round 3 hole 3.3 unplated: 0(-3.81,4.445) 0(3.81,4.445)
  rect 1.7x1.7 hole 1: 1(1.905,-1.905)
  round 1.7 hole 1: 2(0.635,-4.445) 3(-0.635,-1.905) 4(-1.905,-4.445)
Top Overlay:
  lines w0.1: -7.05,-5.455 -7.05,11.05 6.975,11.05 6.975,-5.455 -7.05,-5.455
3D body "RJ-9_44.stp": height 16.5, standoff -3.06, extent -7.01,-5.43 6.96,11.08

## RJ-11 - TJ4-4P4C [mm] "Telephone connector"
height 11.5
pads (6):
  round 3 hole 3 unplated: 0(-3.83,4.445) 0(3.83,4.445)
  rect 1.7x1.7 hole 1: 1(1.905,-1.905)
  round 1.7 hole 1: 2(0.635,-4.445) 3(-0.635,-1.905) 4(-1.905,-4.445)
Top Overlay:
  lines w0.2: -5.6,-5.755 5.6,-5.755 5.6,12.325 -5.6,12.325 -5.6,-5.755
3D body: height 11, standoff 0.5, extent 4.312,-5.75 5.6,12.325
3D body: height 11, standoff 0.5, extent -5.6,-5.75 5.6,2
3D body: height 11, standoff 0.5, extent -5.6,-5.75 -4.312,12.325
3D body: height 1, standoff -3, extent 0.287,-4.794 0.985,-4.095
3D body: height 1, standoff -3, extent -2.253,-4.794 -1.555,-4.095
3D body: height 1, standoff -3, extent 1.557,-2.254 2.255,-1.555
3D body: height 2, standoff 0.5, extent 3,-5.75 5.6,12.325
3D body: height 2, standoff 0.5, extent -5.6,-5.75 -3,12.325
3D body: height 0.5, standoff 0, extent 3.75,-4.75 4.75,2
3D body: height 0.5, standoff 0, extent -2.5,1 2.5,2
3D body: height 0.5, standoff 0, extent -4.75,-4.75 -3.75,2
3D body: height 0.5, standoff 0, extent 1.5,9.75 5.6,12.325
3D body: height 0.5, standoff 0, extent -5.6,9.75 -1.5,12.325
3D body: height 1, standoff -3, extent -0.983,-2.254 -0.285,-1.555
3D body: height 0.5, standoff -3.5, extent 2.33,2.945 5.33,5.945
3D body: height 0.5, standoff -3.5, extent -5.33,2.945 -2.33,5.945
3D body: height 11.5, standoff 10, extent -5.6,-5.75 0,12.325
3D body: height 11.5, standoff 10, extent 0,-5.75 5.6,12.325

## RJ-12 - TJ4-6P6C [mm] "Telephone connector"
height 11.5
pads (8):
  round 3 hole 3 unplated: 0(-5.08,4.445) 0(5.08,4.445)
  rect 1.7x1.7 hole 1: 1(3.175,-4.445)
  round 1.7 hole 1: 2(1.905,-1.905) 3(0.635,-4.445) 4(-0.635,-1.905) 5(-1.905,-4.445) 6(-3.175,-1.905)
Top Overlay:
  lines w0.2: -6.775,-5.8 -6.775,12.45 6.725,12.45 6.725,-5.8 -6.775,-5.8
3D body "RJ-12_54601-906WPLF.STEP": height 11.55, standoff -3.7, extent -6.645,-5.68 6.555,12.32

## RJ-45 - HR911105A [mm] "Ethernet connector"
height 13.5
pads (16):
  round 3.4 hole 3.4 unplated: 0(-5.745,1.995) 0(5.685,1.995)
  rect 1.7x1.7 hole 1: 1(4.43,-4.355)
  round 1.7 hole 1: 2(3.16,-6.895) 3(1.89,-4.355) 4(0.62,-6.895) 5(-0.65,-4.355) 6(-1.92,-6.895) 7(-3.19,-4.355) 8(-4.46,-6.895)
  round 2 hole 1.2: 9(6.625,6.895) 10(4.085,6.895) 11(-4.085,6.895) 12(-6.625,6.895)
  oval 2x2.8 hole 1.63: 13(-7.875,-1.055) 13(7.875,-1.055)
Top Overlay:
  lines w0.2: -7.92,-2.655 -7.92,-8.395 7.905,-8.395 7.905,-2.655 ; -7.92,0.545 -7.92,13.195 7.905,13.195 7.905,0.545
3D body "RJ-45 - HR911105A.STEP": height 13.6, standoff -2.9, extent -7.965,-8.455 7.915,12.945

## RJ-45 - Pulse Jack [mm]
pads (16):
  round 3.5 hole 3.5 unplated: 0(-5.775,0.025) 0(5.655,0.025)
  rect 1.7x1.7 hole 1: 1(4.4,-6.325)
  round 1.7 hole 1: 2(3.13,-8.865) 3(1.86,-6.325) 4(0.59,-8.865) 5(-0.68,-6.325) 6(-1.95,-8.865) 7(-3.22,-6.325) 8(-4.49,-8.865)
  round 2 hole 1.2: 9(6.265,4.925) 10(3.725,3.405) 11(-3.845,4.925) 12(-6.385,3.405)
  oval 2x2.8 hole 1 slot 1.8 at 90 deg: 13(-7.905,-3.025) 13(7.845,-3.025)
Top Overlay:
  lines w0.2: -7.95,-4.625 -7.95,-10.365 7.875,-10.365 7.875,-4.625 ; -7.95,-1.425 -7.95,11.225 7.875,11.225 7.875,-1.425
3D body "RJ-45_1.STEP": height 13.02, standoff -4.01, extent -7.675,-10.575 7.565,10.725

## RJ-45 - RD1-125BAG1A [mm]
height 13.35
pads (16):
  round 3.5 hole 3.5 unplated: 0(-5.745,1.995) 0(5.685,1.995)
  rect 1.7x1.7 hole 1: 1(4.43,-4.355)
  round 1.7 hole 1: 2(3.16,-6.895) 3(1.89,-4.355) 4(0.62,-6.895) 5(-0.65,-4.355) 6(-1.92,-6.895) 7(-3.19,-4.355) 8(-4.46,-6.895)
  round 2 hole 1.2: 9(6.295,6.895) 10(3.755,5.375) 11(-3.815,6.895) 12(-6.355,5.375)
  oval 2x3 hole 1.6: 13(-7.875,-1.055) 13(7.875,-1.055)
Top Overlay:
  lines w0.2: -7.92,-2.655 -7.92,-8.855 7.905,-8.855 7.905,-2.655 ; -7.92,0.545 -7.92,12.92 7.905,12.92 7.905,0.545
3D body "RJ-45_1.STEP": height 13.02, standoff -4.01, extent -7.645,-8.605 7.595,12.695